# Altium schematic symbol library con-garry (Version 2).SCHLIB: 610 symbols (part 16 of 21)

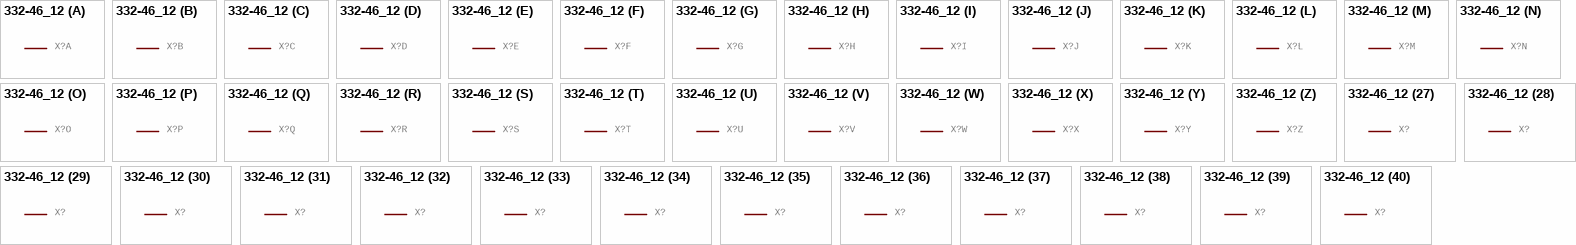
[diagram p345: symbol 332-46_12]

## 332-46_12
designator X?, comment 46 Pin - 2mm Dual Row   Source: www.mpe-connector.de / garry_shortform_2012.pdf  (value not drawn)
GateName_1: -1; SymbolName_1: MV; GateName_2: -2; GateName_3: -3; SymbolName_3: M; GateName_4: -4; GateName_5: -5; GateName_6: -6; GateName_7: -7; GateName_8: -8; GateName_9: -9; GateName_10: -10; GateName_11: -11; GateName_12: -12; GateName_13: -13; GateName_14: -14; GateName_15: -15; GateName_16: -16; GateName_17: -17; GateName_18: -18; GateName_19: -19; GateName_20: -20; GateName_21: -21; GateName_22: -22; GateName_23: -23; GateName_24: -24; GateName_25: -25; GateName_26: -26; GateName_27: -27; GateName_28: -28; GateName_29: -29; GateName_30: -30; GateName_31: -31; GateName_32: -32; GateName_33: -33; GateName_34: -34; GateName_35: -35; GateName_36: -36; GateName_37: -37; GateName_38: -38; GateName_39: -39; GateName_40: -40; GateName_41: -41; GateName_42: -42; GateName_43: -43; GateName_44: -44; GateName_45: -45; GateName_46: -46; DeviceSetName: 332-46; POPULARITY: 1; SymbolName_2: MV; SymbolName_4: M; SymbolName_5: M; SymbolName_6: M; SymbolName_7: M; SymbolName_8: M; SymbolName_9: M; SymbolName_10: M; SymbolName_11: M; SymbolName_12: M; SymbolName_13: M; SymbolName_14: M; SymbolName_15: M; SymbolName_16: M; SymbolName_17: M; SymbolName_18: M; SymbolName_19: M; SymbolName_20: M; SymbolName_21: M; SymbolName_22: M; SymbolName_23: M; SymbolName_24: M; SymbolName_25: M; SymbolName_26: M; SymbolName_27: M; SymbolName_28: M; SymbolName_29: M; SymbolName_30: M; SymbolName_31: M; SymbolName_32: M; SymbolName_33: M; SymbolName_34: M; SymbolName_35: M; SymbolName_36: M; SymbolName_37: M; SymbolName_38: M; SymbolName_39: M; SymbolName_40: M; SymbolName_41: M; SymbolName_42: M; SymbolName_43: M; SymbolName_44: M; SymbolName_45: M; SymbolName_46: M; LibraryName: con-garry (Version 2); Package: 332-46
footprint 332-46
part A pins: 1 S
part B pins: 2 S
part C pins: 3 S
part D pins: 4 S
part E pins: 5 S
part F pins: 6 S
part G pins: 7 S
part H pins: 8 S
part I pins: 9 S
part J pins: 10 S
part K pins: 11 S
part L pins: 12 S
part M pins: 13 S
part N pins: 14 S
part O pins: 15 S
part P pins: 16 S
part Q pins: 17 S
part R pins: 18 S
part S pins: 19 S
part T pins: 20 S
part U pins: 21 S
part V pins: 22 S
part W pins: 23 S
part X pins: 24 S
part Y pins: 25 S
part Z pins: 26 S
part 27 pins: 27 S
part 28 pins: 28 S
part 29 pins: 29 S
part 30 pins: 30 S
part 31 pins: 31 S
part 32 pins: 32 S
part 33 pins: 33 S
part 34 pins: 34 S
part 35 pins: 35 S
part 36 pins: 36 S
part 37 pins: 37 S
part 38 pins: 38 S
part 39 pins: 39 S
part 40 pins: 40 S
part 41 pins: 41 S
part 42 pins: 42 S
part 43 pins: 43 S
part 44 pins: 44 S
part 45 pins: 45 S
part 46 pins: 46 S

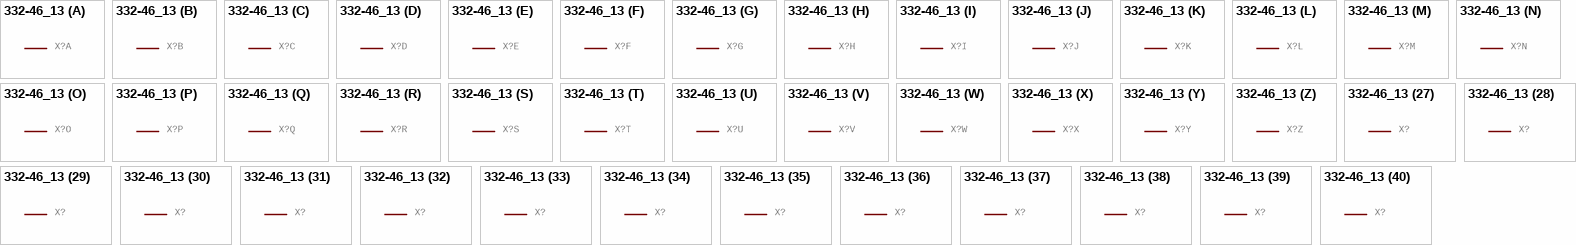
[diagram p346: symbol 332-46_13]

## 332-46_13
designator X?, comment 46 Pin - 2mm Dual Row   Source: www.mpe-connector.de / garry_shortform_2012.pdf  (value not drawn)
GateName_1: -1; SymbolName_1: MV; GateName_2: -2; GateName_3: -3; SymbolName_3: M; GateName_4: -4; GateName_5: -5; GateName_6: -6; GateName_7: -7; GateName_8: -8; GateName_9: -9; GateName_10: -10; GateName_11: -11; GateName_12: -12; GateName_13: -13; GateName_14: -14; GateName_15: -15; GateName_16: -16; GateName_17: -17; GateName_18: -18; GateName_19: -19; GateName_20: -20; GateName_21: -21; GateName_22: -22; GateName_23: -23; GateName_24: -24; GateName_25: -25; GateName_26: -26; GateName_27: -27; GateName_28: -28; GateName_29: -29; GateName_30: -30; GateName_31: -31; GateName_32: -32; GateName_33: -33; GateName_34: -34; GateName_35: -35; GateName_36: -36; GateName_37: -37; GateName_38: -38; GateName_39: -39; GateName_40: -40; GateName_41: -41; GateName_42: -42; GateName_43: -43; GateName_44: -44; GateName_45: -45; GateName_46: -46; DeviceSetName: 332-46; POPULARITY: 1; SymbolName_2: MV; SymbolName_4: M; SymbolName_5: M; SymbolName_6: M; SymbolName_7: M; SymbolName_8: M; SymbolName_9: M; SymbolName_10: M; SymbolName_11: M; SymbolName_12: M; SymbolName_13: M; SymbolName_14: M; SymbolName_15: M; SymbolName_16: M; SymbolName_17: M; SymbolName_18: M; SymbolName_19: M; SymbolName_20: M; SymbolName_21: M; SymbolName_22: M; SymbolName_23: M; SymbolName_24: M; SymbolName_25: M; SymbolName_26: M; SymbolName_27: M; SymbolName_28: M; SymbolName_29: M; SymbolName_30: M; SymbolName_31: M; SymbolName_32: M; SymbolName_33: M; SymbolName_34: M; SymbolName_35: M; SymbolName_36: M; SymbolName_37: M; SymbolName_38: M; SymbolName_39: M; SymbolName_40: M; SymbolName_41: M; SymbolName_42: M; SymbolName_43: M; SymbolName_44: M; SymbolName_45: M; SymbolName_46: M; LibraryName: con-garry (Version 2); Package: 332-46
footprint 332-46
part A pins: 1 S
part B pins: 2 S
part C pins: 3 S
part D pins: 4 S
part E pins: 5 S
part F pins: 6 S
part G pins: 7 S
part H pins: 8 S
part I pins: 9 S
part J pins: 10 S
part K pins: 11 S
part L pins: 12 S
part M pins: 13 S
part N pins: 14 S
part O pins: 15 S
part P pins: 16 S
part Q pins: 17 S
part R pins: 18 S
part S pins: 19 S
part T pins: 20 S
part U pins: 21 S
part V pins: 22 S
part W pins: 23 S
part X pins: 24 S
part Y pins: 25 S
part Z pins: 26 S
part 27 pins: 27 S
part 28 pins: 28 S
part 29 pins: 29 S
part 30 pins: 30 S
part 31 pins: 31 S
part 32 pins: 32 S
part 33 pins: 33 S
part 34 pins: 34 S
part 35 pins: 35 S
part 36 pins: 36 S
part 37 pins: 37 S
part 38 pins: 38 S
part 39 pins: 39 S
part 40 pins: 40 S
part 41 pins: 41 S
part 42 pins: 42 S
part 43 pins: 43 S
part 44 pins: 44 S
part 45 pins: 45 S
part 46 pins: 46 S

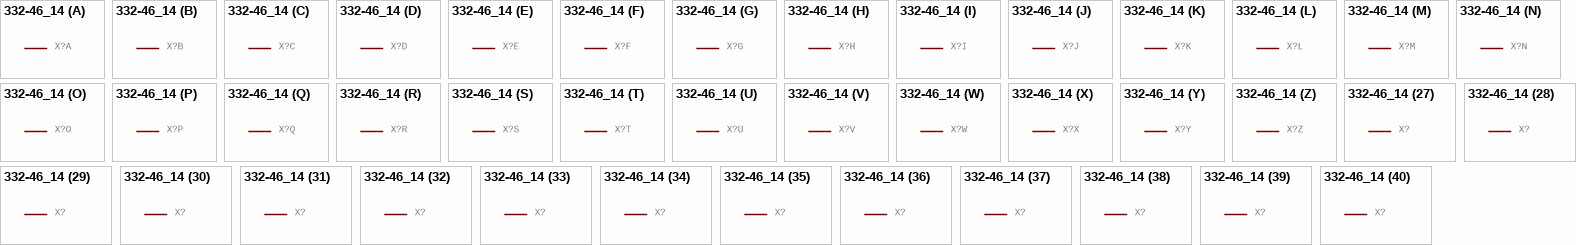
[diagram p347: symbol 332-46_14]

## 332-46_14
designator X?, comment 46 Pin - 2mm Dual Row   Source: www.mpe-connector.de / garry_shortform_2012.pdf  (value not drawn)
GateName_1: -1; SymbolName_1: MV; GateName_2: -2; GateName_3: -3; SymbolName_3: M; GateName_4: -4; GateName_5: -5; GateName_6: -6; GateName_7: -7; GateName_8: -8; GateName_9: -9; GateName_10: -10; GateName_11: -11; GateName_12: -12; GateName_13: -13; GateName_14: -14; GateName_15: -15; GateName_16: -16; GateName_17: -17; GateName_18: -18; GateName_19: -19; GateName_20: -20; GateName_21: -21; GateName_22: -22; GateName_23: -23; GateName_24: -24; GateName_25: -25; GateName_26: -26; GateName_27: -27; GateName_28: -28; GateName_29: -29; GateName_30: -30; GateName_31: -31; GateName_32: -32; GateName_33: -33; GateName_34: -34; GateName_35: -35; GateName_36: -36; GateName_37: -37; GateName_38: -38; GateName_39: -39; GateName_40: -40; GateName_41: -41; GateName_42: -42; GateName_43: -43; GateName_44: -44; GateName_45: -45; GateName_46: -46; DeviceSetName: 332-46; POPULARITY: 1; SymbolName_2: MV; SymbolName_4: M; SymbolName_5: M; SymbolName_6: M; SymbolName_7: M; SymbolName_8: M; SymbolName_9: M; SymbolName_10: M; SymbolName_11: M; SymbolName_12: M; SymbolName_13: M; SymbolName_14: M; SymbolName_15: M; SymbolName_16: M; SymbolName_17: M; SymbolName_18: M; SymbolName_19: M; SymbolName_20: M; SymbolName_21: M; SymbolName_22: M; SymbolName_23: M; SymbolName_24: M; SymbolName_25: M; SymbolName_26: M; SymbolName_27: M; SymbolName_28: M; SymbolName_29: M; SymbolName_30: M; SymbolName_31: M; SymbolName_32: M; SymbolName_33: M; SymbolName_34: M; SymbolName_35: M; SymbolName_36: M; SymbolName_37: M; SymbolName_38: M; SymbolName_39: M; SymbolName_40: M; SymbolName_41: M; SymbolName_42: M; SymbolName_43: M; SymbolName_44: M; SymbolName_45: M; SymbolName_46: M; LibraryName: con-garry (Version 2); Package: 332-46
footprint 332-46
part A pins: 1 S
part B pins: 2 S
part C pins: 3 S
part D pins: 4 S
part E pins: 5 S
part F pins: 6 S
part G pins: 7 S
part H pins: 8 S
part I pins: 9 S
part J pins: 10 S
part K pins: 11 S
part L pins: 12 S
part M pins: 13 S
part N pins: 14 S
part O pins: 15 S
part P pins: 16 S
part Q pins: 17 S
part R pins: 18 S
part S pins: 19 S
part T pins: 20 S
part U pins: 21 S
part V pins: 22 S
part W pins: 23 S
part X pins: 24 S
part Y pins: 25 S
part Z pins: 26 S
part 27 pins: 27 S
part 28 pins: 28 S
part 29 pins: 29 S
part 30 pins: 30 S
part 31 pins: 31 S
part 32 pins: 32 S
part 33 pins: 33 S
part 34 pins: 34 S
part 35 pins: 35 S
part 36 pins: 36 S
part 37 pins: 37 S
part 38 pins: 38 S
part 39 pins: 39 S
part 40 pins: 40 S
part 41 pins: 41 S
part 42 pins: 42 S
part 43 pins: 43 S
part 44 pins: 44 S
part 45 pins: 45 S
part 46 pins: 46 S

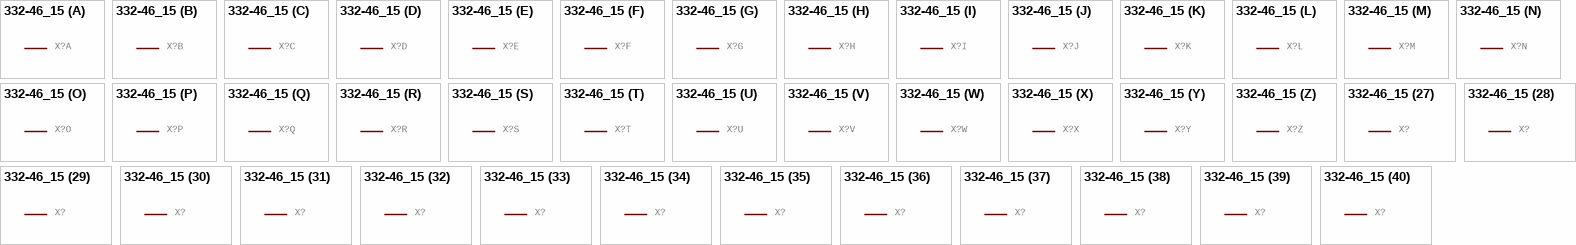
[diagram p348: symbol 332-46_15]

## 332-46_15
designator X?, comment 46 Pin - 2mm Dual Row   Source: www.mpe-connector.de / garry_shortform_2012.pdf  (value not drawn)
GateName_1: -1; SymbolName_1: MV; GateName_2: -2; GateName_3: -3; SymbolName_3: M; GateName_4: -4; GateName_5: -5; GateName_6: -6; GateName_7: -7; GateName_8: -8; GateName_9: -9; GateName_10: -10; GateName_11: -11; GateName_12: -12; GateName_13: -13; GateName_14: -14; GateName_15: -15; GateName_16: -16; GateName_17: -17; GateName_18: -18; GateName_19: -19; GateName_20: -20; GateName_21: -21; GateName_22: -22; GateName_23: -23; GateName_24: -24; GateName_25: -25; GateName_26: -26; GateName_27: -27; GateName_28: -28; GateName_29: -29; GateName_30: -30; GateName_31: -31; GateName_32: -32; GateName_33: -33; GateName_34: -34; GateName_35: -35; GateName_36: -36; GateName_37: -37; GateName_38: -38; GateName_39: -39; GateName_40: -40; GateName_41: -41; GateName_42: -42; GateName_43: -43; GateName_44: -44; GateName_45: -45; GateName_46: -46; DeviceSetName: 332-46; POPULARITY: 1; SymbolName_2: MV; SymbolName_4: M; SymbolName_5: M; SymbolName_6: M; SymbolName_7: M; SymbolName_8: M; SymbolName_9: M; SymbolName_10: M; SymbolName_11: M; SymbolName_12: M; SymbolName_13: M; SymbolName_14: M; SymbolName_15: M; SymbolName_16: M; SymbolName_17: M; SymbolName_18: M; SymbolName_19: M; SymbolName_20: M; SymbolName_21: M; SymbolName_22: M; SymbolName_23: M; SymbolName_24: M; SymbolName_25: M; SymbolName_26: M; SymbolName_27: M; SymbolName_28: M; SymbolName_29: M; SymbolName_30: M; SymbolName_31: M; SymbolName_32: M; SymbolName_33: M; SymbolName_34: M; SymbolName_35: M; SymbolName_36: M; SymbolName_37: M; SymbolName_38: M; SymbolName_39: M; SymbolName_40: M; SymbolName_41: M; SymbolName_42: M; SymbolName_43: M; SymbolName_44: M; SymbolName_45: M; SymbolName_46: M; LibraryName: con-garry (Version 2); Package: 332-46
footprint 332-46
part A pins: 1 S
part B pins: 2 S
part C pins: 3 S
part D pins: 4 S
part E pins: 5 S
part F pins: 6 S
part G pins: 7 S
part H pins: 8 S
part I pins: 9 S
part J pins: 10 S
part K pins: 11 S
part L pins: 12 S
part M pins: 13 S
part N pins: 14 S
part O pins: 15 S
part P pins: 16 S
part Q pins: 17 S
part R pins: 18 S
part S pins: 19 S
part T pins: 20 S
part U pins: 21 S
part V pins: 22 S
part W pins: 23 S
part X pins: 24 S
part Y pins: 25 S
part Z pins: 26 S
part 27 pins: 27 S
part 28 pins: 28 S
part 29 pins: 29 S
part 30 pins: 30 S
part 31 pins: 31 S
part 32 pins: 32 S
part 33 pins: 33 S
part 34 pins: 34 S
part 35 pins: 35 S
part 36 pins: 36 S
part 37 pins: 37 S
part 38 pins: 38 S
part 39 pins: 39 S
part 40 pins: 40 S
part 41 pins: 41 S
part 42 pins: 42 S
part 43 pins: 43 S
part 44 pins: 44 S
part 45 pins: 45 S
part 46 pins: 46 S

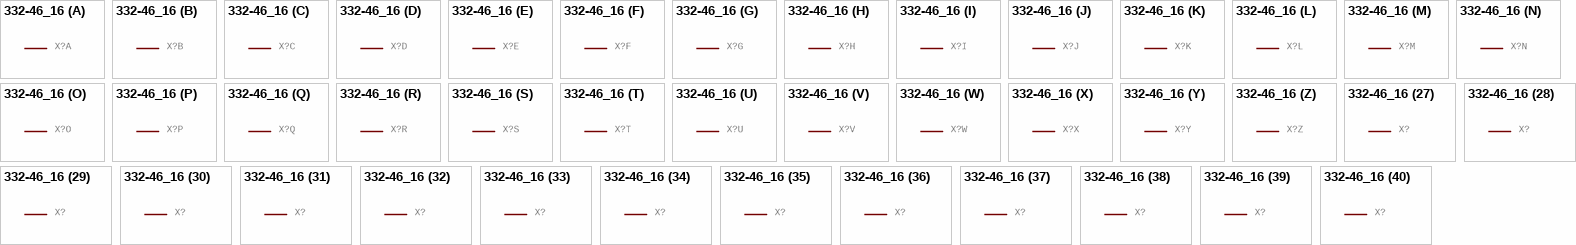
[diagram p349: symbol 332-46_16]

## 332-46_16
designator X?, comment 46 Pin - 2mm Dual Row   Source: www.mpe-connector.de / garry_shortform_2012.pdf  (value not drawn)
GateName_1: -1; SymbolName_1: MV; GateName_2: -2; GateName_3: -3; SymbolName_3: M; GateName_4: -4; GateName_5: -5; GateName_6: -6; GateName_7: -7; GateName_8: -8; GateName_9: -9; GateName_10: -10; GateName_11: -11; GateName_12: -12; GateName_13: -13; GateName_14: -14; GateName_15: -15; GateName_16: -16; GateName_17: -17; GateName_18: -18; GateName_19: -19; GateName_20: -20; GateName_21: -21; GateName_22: -22; GateName_23: -23; GateName_24: -24; GateName_25: -25; GateName_26: -26; GateName_27: -27; GateName_28: -28; GateName_29: -29; GateName_30: -30; GateName_31: -31; GateName_32: -32; GateName_33: -33; GateName_34: -34; GateName_35: -35; GateName_36: -36; GateName_37: -37; GateName_38: -38; GateName_39: -39; GateName_40: -40; GateName_41: -41; GateName_42: -42; GateName_43: -43; GateName_44: -44; GateName_45: -45; GateName_46: -46; DeviceSetName: 332-46; POPULARITY: 1; SymbolName_2: MV; SymbolName_4: M; SymbolName_5: M; SymbolName_6: M; SymbolName_7: M; SymbolName_8: M; SymbolName_9: M; SymbolName_10: M; SymbolName_11: M; SymbolName_12: M; SymbolName_13: M; SymbolName_14: M; SymbolName_15: M; SymbolName_16: M; SymbolName_17: M; SymbolName_18: M; SymbolName_19: M; SymbolName_20: M; SymbolName_21: M; SymbolName_22: M; SymbolName_23: M; SymbolName_24: M; SymbolName_25: M; SymbolName_26: M; SymbolName_27: M; SymbolName_28: M; SymbolName_29: M; SymbolName_30: M; SymbolName_31: M; SymbolName_32: M; SymbolName_33: M; SymbolName_34: M; SymbolName_35: M; SymbolName_36: M; SymbolName_37: M; SymbolName_38: M; SymbolName_39: M; SymbolName_40: M; SymbolName_41: M; SymbolName_42: M; SymbolName_43: M; SymbolName_44: M; SymbolName_45: M; SymbolName_46: M; LibraryName: con-garry (Version 2); Package: 332-46
footprint 332-46
part A pins: 1 S
part B pins: 2 S
part C pins: 3 S
part D pins: 4 S
part E pins: 5 S
part F pins: 6 S
part G pins: 7 S
part H pins: 8 S
part I pins: 9 S
part J pins: 10 S
part K pins: 11 S
part L pins: 12 S
part M pins: 13 S
part N pins: 14 S
part O pins: 15 S
part P pins: 16 S
part Q pins: 17 S
part R pins: 18 S
part S pins: 19 S
part T pins: 20 S
part U pins: 21 S
part V pins: 22 S
part W pins: 23 S
part X pins: 24 S
part Y pins: 25 S
part Z pins: 26 S
part 27 pins: 27 S
part 28 pins: 28 S
part 29 pins: 29 S
part 30 pins: 30 S
part 31 pins: 31 S
part 32 pins: 32 S
part 33 pins: 33 S
part 34 pins: 34 S
part 35 pins: 35 S
part 36 pins: 36 S
part 37 pins: 37 S
part 38 pins: 38 S
part 39 pins: 39 S
part 40 pins: 40 S
part 41 pins: 41 S
part 42 pins: 42 S
part 43 pins: 43 S
part 44 pins: 44 S
part 45 pins: 45 S
part 46 pins: 46 S

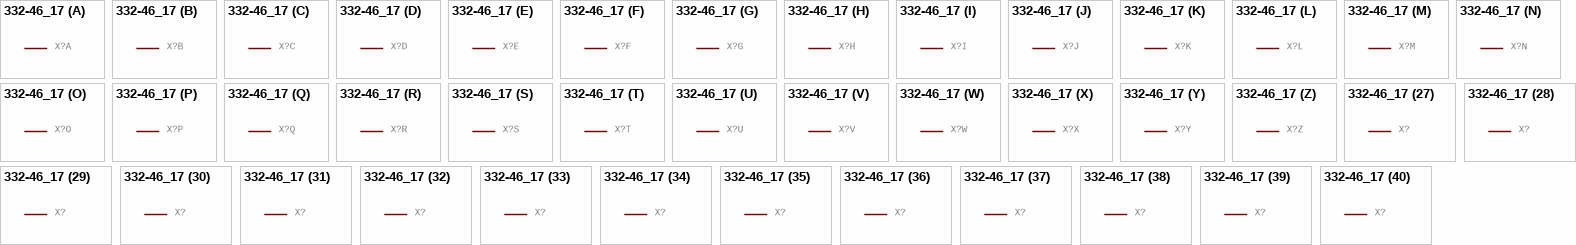
[diagram p350: symbol 332-46_17]

## 332-46_17
designator X?, comment 46 Pin - 2mm Dual Row   Source: www.mpe-connector.de / garry_shortform_2012.pdf  (value not drawn)
GateName_1: -1; SymbolName_1: MV; GateName_2: -2; GateName_3: -3; SymbolName_3: M; GateName_4: -4; GateName_5: -5; GateName_6: -6; GateName_7: -7; GateName_8: -8; GateName_9: -9; GateName_10: -10; GateName_11: -11; GateName_12: -12; GateName_13: -13; GateName_14: -14; GateName_15: -15; GateName_16: -16; GateName_17: -17; GateName_18: -18; GateName_19: -19; GateName_20: -20; GateName_21: -21; GateName_22: -22; GateName_23: -23; GateName_24: -24; GateName_25: -25; GateName_26: -26; GateName_27: -27; GateName_28: -28; GateName_29: -29; GateName_30: -30; GateName_31: -31; GateName_32: -32; GateName_33: -33; GateName_34: -34; GateName_35: -35; GateName_36: -36; GateName_37: -37; GateName_38: -38; GateName_39: -39; GateName_40: -40; GateName_41: -41; GateName_42: -42; GateName_43: -43; GateName_44: -44; GateName_45: -45; GateName_46: -46; DeviceSetName: 332-46; POPULARITY: 1; SymbolName_2: MV; SymbolName_4: M; SymbolName_5: M; SymbolName_6: M; SymbolName_7: M; SymbolName_8: M; SymbolName_9: M; SymbolName_10: M; SymbolName_11: M; SymbolName_12: M; SymbolName_13: M; SymbolName_14: M; SymbolName_15: M; SymbolName_16: M; SymbolName_17: M; SymbolName_18: M; SymbolName_19: M; SymbolName_20: M; SymbolName_21: M; SymbolName_22: M; SymbolName_23: M; SymbolName_24: M; SymbolName_25: M; SymbolName_26: M; SymbolName_27: M; SymbolName_28: M; SymbolName_29: M; SymbolName_30: M; SymbolName_31: M; SymbolName_32: M; SymbolName_33: M; SymbolName_34: M; SymbolName_35: M; SymbolName_36: M; SymbolName_37: M; SymbolName_38: M; SymbolName_39: M; SymbolName_40: M; SymbolName_41: M; SymbolName_42: M; SymbolName_43: M; SymbolName_44: M; SymbolName_45: M; SymbolName_46: M; LibraryName: con-garry (Version 2); Package: 332-46
footprint 332-46
part A pins: 1 S
part B pins: 2 S
part C pins: 3 S
part D pins: 4 S
part E pins: 5 S
part F pins: 6 S
part G pins: 7 S
part H pins: 8 S
part I pins: 9 S
part J pins: 10 S
part K pins: 11 S
part L pins: 12 S
part M pins: 13 S
part N pins: 14 S
part O pins: 15 S
part P pins: 16 S
part Q pins: 17 S
part R pins: 18 S
part S pins: 19 S
part T pins: 20 S
part U pins: 21 S
part V pins: 22 S
part W pins: 23 S
part X pins: 24 S
part Y pins: 25 S
part Z pins: 26 S
part 27 pins: 27 S
part 28 pins: 28 S
part 29 pins: 29 S
part 30 pins: 30 S
part 31 pins: 31 S
part 32 pins: 32 S
part 33 pins: 33 S
part 34 pins: 34 S
part 35 pins: 35 S
part 36 pins: 36 S
part 37 pins: 37 S
part 38 pins: 38 S
part 39 pins: 39 S
part 40 pins: 40 S
part 41 pins: 41 S
part 42 pins: 42 S
part 43 pins: 43 S
part 44 pins: 44 S
part 45 pins: 45 S
part 46 pins: 46 S

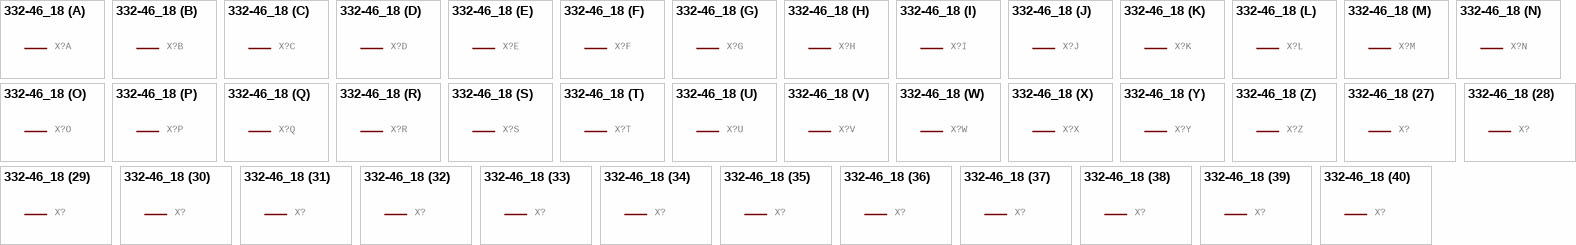
[diagram p351: symbol 332-46_18]

## 332-46_18
designator X?, comment 46 Pin - 2mm Dual Row   Source: www.mpe-connector.de / garry_shortform_2012.pdf  (value not drawn)
GateName_1: -1; SymbolName_1: MV; GateName_2: -2; GateName_3: -3; SymbolName_3: M; GateName_4: -4; GateName_5: -5; GateName_6: -6; GateName_7: -7; GateName_8: -8; GateName_9: -9; GateName_10: -10; GateName_11: -11; GateName_12: -12; GateName_13: -13; GateName_14: -14; GateName_15: -15; GateName_16: -16; GateName_17: -17; GateName_18: -18; GateName_19: -19; GateName_20: -20; GateName_21: -21; GateName_22: -22; GateName_23: -23; GateName_24: -24; GateName_25: -25; GateName_26: -26; GateName_27: -27; GateName_28: -28; GateName_29: -29; GateName_30: -30; GateName_31: -31; GateName_32: -32; GateName_33: -33; GateName_34: -34; GateName_35: -35; GateName_36: -36; GateName_37: -37; GateName_38: -38; GateName_39: -39; GateName_40: -40; GateName_41: -41; GateName_42: -42; GateName_43: -43; GateName_44: -44; GateName_45: -45; GateName_46: -46; DeviceSetName: 332-46; POPULARITY: 1; SymbolName_2: MV; SymbolName_4: M; SymbolName_5: M; SymbolName_6: M; SymbolName_7: M; SymbolName_8: M; SymbolName_9: M; SymbolName_10: M; SymbolName_11: M; SymbolName_12: M; SymbolName_13: M; SymbolName_14: M; SymbolName_15: M; SymbolName_16: M; SymbolName_17: M; SymbolName_18: M; SymbolName_19: M; SymbolName_20: M; SymbolName_21: M; SymbolName_22: M; SymbolName_23: M; SymbolName_24: M; SymbolName_25: M; SymbolName_26: M; SymbolName_27: M; SymbolName_28: M; SymbolName_29: M; SymbolName_30: M; SymbolName_31: M; SymbolName_32: M; SymbolName_33: M; SymbolName_34: M; SymbolName_35: M; SymbolName_36: M; SymbolName_37: M; SymbolName_38: M; SymbolName_39: M; SymbolName_40: M; SymbolName_41: M; SymbolName_42: M; SymbolName_43: M; SymbolName_44: M; SymbolName_45: M; SymbolName_46: M; LibraryName: con-garry (Version 2); Package: 332-46
footprint 332-46
part A pins: 1 S
part B pins: 2 S
part C pins: 3 S
part D pins: 4 S
part E pins: 5 S
part F pins: 6 S
part G pins: 7 S
part H pins: 8 S
part I pins: 9 S
part J pins: 10 S
part K pins: 11 S
part L pins: 12 S
part M pins: 13 S
part N pins: 14 S
part O pins: 15 S
part P pins: 16 S
part Q pins: 17 S
part R pins: 18 S
part S pins: 19 S
part T pins: 20 S
part U pins: 21 S
part V pins: 22 S
part W pins: 23 S
part X pins: 24 S
part Y pins: 25 S
part Z pins: 26 S
part 27 pins: 27 S
part 28 pins: 28 S
part 29 pins: 29 S
part 30 pins: 30 S
part 31 pins: 31 S
part 32 pins: 32 S
part 33 pins: 33 S
part 34 pins: 34 S
part 35 pins: 35 S
part 36 pins: 36 S
part 37 pins: 37 S
part 38 pins: 38 S
part 39 pins: 39 S
part 40 pins: 40 S
part 41 pins: 41 S
part 42 pins: 42 S
part 43 pins: 43 S
part 44 pins: 44 S
part 45 pins: 45 S
part 46 pins: 46 S

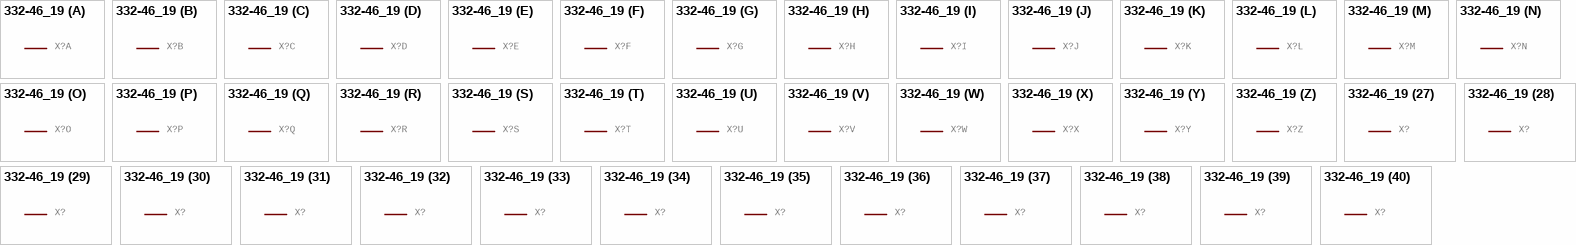
[diagram p352: symbol 332-46_19]

## 332-46_19
designator X?, comment 46 Pin - 2mm Dual Row   Source: www.mpe-connector.de / garry_shortform_2012.pdf  (value not drawn)
GateName_1: -1; SymbolName_1: MV; GateName_2: -2; GateName_3: -3; SymbolName_3: M; GateName_4: -4; GateName_5: -5; GateName_6: -6; GateName_7: -7; GateName_8: -8; GateName_9: -9; GateName_10: -10; GateName_11: -11; GateName_12: -12; GateName_13: -13; GateName_14: -14; GateName_15: -15; GateName_16: -16; GateName_17: -17; GateName_18: -18; GateName_19: -19; GateName_20: -20; GateName_21: -21; GateName_22: -22; GateName_23: -23; GateName_24: -24; GateName_25: -25; GateName_26: -26; GateName_27: -27; GateName_28: -28; GateName_29: -29; GateName_30: -30; GateName_31: -31; GateName_32: -32; GateName_33: -33; GateName_34: -34; GateName_35: -35; GateName_36: -36; GateName_37: -37; GateName_38: -38; GateName_39: -39; GateName_40: -40; GateName_41: -41; GateName_42: -42; GateName_43: -43; GateName_44: -44; GateName_45: -45; GateName_46: -46; DeviceSetName: 332-46; POPULARITY: 1; SymbolName_2: MV; SymbolName_4: M; SymbolName_5: M; SymbolName_6: M; SymbolName_7: M; SymbolName_8: M; SymbolName_9: M; SymbolName_10: M; SymbolName_11: M; SymbolName_12: M; SymbolName_13: M; SymbolName_14: M; SymbolName_15: M; SymbolName_16: M; SymbolName_17: M; SymbolName_18: M; SymbolName_19: M; SymbolName_20: M; SymbolName_21: M; SymbolName_22: M; SymbolName_23: M; SymbolName_24: M; SymbolName_25: M; SymbolName_26: M; SymbolName_27: M; SymbolName_28: M; SymbolName_29: M; SymbolName_30: M; SymbolName_31: M; SymbolName_32: M; SymbolName_33: M; SymbolName_34: M; SymbolName_35: M; SymbolName_36: M; SymbolName_37: M; SymbolName_38: M; SymbolName_39: M; SymbolName_40: M; SymbolName_41: M; SymbolName_42: M; SymbolName_43: M; SymbolName_44: M; SymbolName_45: M; SymbolName_46: M; LibraryName: con-garry (Version 2); Package: 332-46
footprint 332-46
part A pins: 1 S
part B pins: 2 S
part C pins: 3 S
part D pins: 4 S
part E pins: 5 S
part F pins: 6 S
part G pins: 7 S
part H pins: 8 S
part I pins: 9 S
part J pins: 10 S
part K pins: 11 S
part L pins: 12 S
part M pins: 13 S
part N pins: 14 S
part O pins: 15 S
part P pins: 16 S
part Q pins: 17 S
part R pins: 18 S
part S pins: 19 S
part T pins: 20 S
part U pins: 21 S
part V pins: 22 S
part W pins: 23 S
part X pins: 24 S
part Y pins: 25 S
part Z pins: 26 S
part 27 pins: 27 S
part 28 pins: 28 S
part 29 pins: 29 S
part 30 pins: 30 S
part 31 pins: 31 S
part 32 pins: 32 S
part 33 pins: 33 S
part 34 pins: 34 S
part 35 pins: 35 S
part 36 pins: 36 S
part 37 pins: 37 S
part 38 pins: 38 S
part 39 pins: 39 S
part 40 pins: 40 S
part 41 pins: 41 S
part 42 pins: 42 S
part 43 pins: 43 S
part 44 pins: 44 S
part 45 pins: 45 S
part 46 pins: 46 S

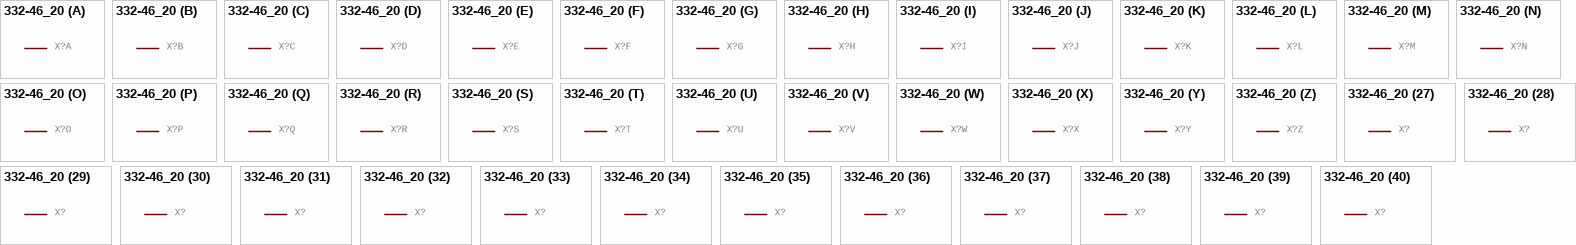
[diagram p353: symbol 332-46_20]

## 332-46_20
designator X?, comment 46 Pin - 2mm Dual Row   Source: www.mpe-connector.de / garry_shortform_2012.pdf  (value not drawn)
GateName_1: -1; SymbolName_1: MV; GateName_2: -2; GateName_3: -3; SymbolName_3: M; GateName_4: -4; GateName_5: -5; GateName_6: -6; GateName_7: -7; GateName_8: -8; GateName_9: -9; GateName_10: -10; GateName_11: -11; GateName_12: -12; GateName_13: -13; GateName_14: -14; GateName_15: -15; GateName_16: -16; GateName_17: -17; GateName_18: -18; GateName_19: -19; GateName_20: -20; GateName_21: -21; GateName_22: -22; GateName_23: -23; GateName_24: -24; GateName_25: -25; GateName_26: -26; GateName_27: -27; GateName_28: -28; GateName_29: -29; GateName_30: -30; GateName_31: -31; GateName_32: -32; GateName_33: -33; GateName_34: -34; GateName_35: -35; GateName_36: -36; GateName_37: -37; GateName_38: -38; GateName_39: -39; GateName_40: -40; GateName_41: -41; GateName_42: -42; GateName_43: -43; GateName_44: -44; GateName_45: -45; GateName_46: -46; DeviceSetName: 332-46; POPULARITY: 1; SymbolName_2: MV; SymbolName_4: M; SymbolName_5: M; SymbolName_6: M; SymbolName_7: M; SymbolName_8: M; SymbolName_9: M; SymbolName_10: M; SymbolName_11: M; SymbolName_12: M; SymbolName_13: M; SymbolName_14: M; SymbolName_15: M; SymbolName_16: M; SymbolName_17: M; SymbolName_18: M; SymbolName_19: M; SymbolName_20: M; SymbolName_21: M; SymbolName_22: M; SymbolName_23: M; SymbolName_24: M; SymbolName_25: M; SymbolName_26: M; SymbolName_27: M; SymbolName_28: M; SymbolName_29: M; SymbolName_30: M; SymbolName_31: M; SymbolName_32: M; SymbolName_33: M; SymbolName_34: M; SymbolName_35: M; SymbolName_36: M; SymbolName_37: M; SymbolName_38: M; SymbolName_39: M; SymbolName_40: M; SymbolName_41: M; SymbolName_42: M; SymbolName_43: M; SymbolName_44: M; SymbolName_45: M; SymbolName_46: M; LibraryName: con-garry (Version 2); Package: 332-46
footprint 332-46
part A pins: 1 S
part B pins: 2 S
part C pins: 3 S
part D pins: 4 S
part E pins: 5 S
part F pins: 6 S
part G pins: 7 S
part H pins: 8 S
part I pins: 9 S
part J pins: 10 S
part K pins: 11 S
part L pins: 12 S
part M pins: 13 S
part N pins: 14 S
part O pins: 15 S
part P pins: 16 S
part Q pins: 17 S
part R pins: 18 S
part S pins: 19 S
part T pins: 20 S
part U pins: 21 S
part V pins: 22 S
part W pins: 23 S
part X pins: 24 S
part Y pins: 25 S
part Z pins: 26 S
part 27 pins: 27 S
part 28 pins: 28 S
part 29 pins: 29 S
part 30 pins: 30 S
part 31 pins: 31 S
part 32 pins: 32 S
part 33 pins: 33 S
part 34 pins: 34 S
part 35 pins: 35 S
part 36 pins: 36 S
part 37 pins: 37 S
part 38 pins: 38 S
part 39 pins: 39 S
part 40 pins: 40 S
part 41 pins: 41 S
part 42 pins: 42 S
part 43 pins: 43 S
part 44 pins: 44 S
part 45 pins: 45 S
part 46 pins: 46 S

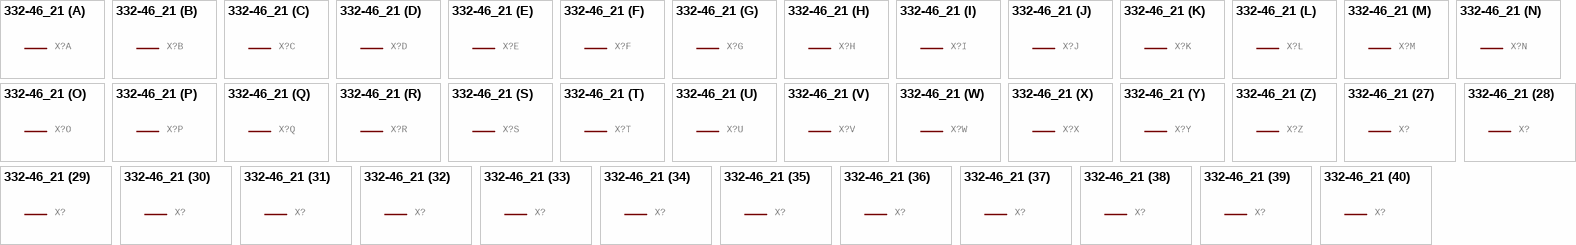
[diagram p354: symbol 332-46_21]

## 332-46_21
designator X?, comment 46 Pin - 2mm Dual Row   Source: www.mpe-connector.de / garry_shortform_2012.pdf  (value not drawn)
GateName_1: -1; SymbolName_1: MV; GateName_2: -2; GateName_3: -3; SymbolName_3: M; GateName_4: -4; GateName_5: -5; GateName_6: -6; GateName_7: -7; GateName_8: -8; GateName_9: -9; GateName_10: -10; GateName_11: -11; GateName_12: -12; GateName_13: -13; GateName_14: -14; GateName_15: -15; GateName_16: -16; GateName_17: -17; GateName_18: -18; GateName_19: -19; GateName_20: -20; GateName_21: -21; GateName_22: -22; GateName_23: -23; GateName_24: -24; GateName_25: -25; GateName_26: -26; GateName_27: -27; GateName_28: -28; GateName_29: -29; GateName_30: -30; GateName_31: -31; GateName_32: -32; GateName_33: -33; GateName_34: -34; GateName_35: -35; GateName_36: -36; GateName_37: -37; GateName_38: -38; GateName_39: -39; GateName_40: -40; GateName_41: -41; GateName_42: -42; GateName_43: -43; GateName_44: -44; GateName_45: -45; GateName_46: -46; DeviceSetName: 332-46; POPULARITY: 1; SymbolName_2: MV; SymbolName_4: M; SymbolName_5: M; SymbolName_6: M; SymbolName_7: M; SymbolName_8: M; SymbolName_9: M; SymbolName_10: M; SymbolName_11: M; SymbolName_12: M; SymbolName_13: M; SymbolName_14: M; SymbolName_15: M; SymbolName_16: M; SymbolName_17: M; SymbolName_18: M; SymbolName_19: M; SymbolName_20: M; SymbolName_21: M; SymbolName_22: M; SymbolName_23: M; SymbolName_24: M; SymbolName_25: M; SymbolName_26: M; SymbolName_27: M; SymbolName_28: M; SymbolName_29: M; SymbolName_30: M; SymbolName_31: M; SymbolName_32: M; SymbolName_33: M; SymbolName_34: M; SymbolName_35: M; SymbolName_36: M; SymbolName_37: M; SymbolName_38: M; SymbolName_39: M; SymbolName_40: M; SymbolName_41: M; SymbolName_42: M; SymbolName_43: M; SymbolName_44: M; SymbolName_45: M; SymbolName_46: M; LibraryName: con-garry (Version 2); Package: 332-46
footprint 332-46
part A pins: 1 S
part B pins: 2 S
part C pins: 3 S
part D pins: 4 S
part E pins: 5 S
part F pins: 6 S
part G pins: 7 S
part H pins: 8 S
part I pins: 9 S
part J pins: 10 S
part K pins: 11 S
part L pins: 12 S
part M pins: 13 S
part N pins: 14 S
part O pins: 15 S
part P pins: 16 S
part Q pins: 17 S
part R pins: 18 S
part S pins: 19 S
part T pins: 20 S
part U pins: 21 S
part V pins: 22 S
part W pins: 23 S
part X pins: 24 S
part Y pins: 25 S
part Z pins: 26 S
part 27 pins: 27 S
part 28 pins: 28 S
part 29 pins: 29 S
part 30 pins: 30 S
part 31 pins: 31 S
part 32 pins: 32 S
part 33 pins: 33 S
part 34 pins: 34 S
part 35 pins: 35 S
part 36 pins: 36 S
part 37 pins: 37 S
part 38 pins: 38 S
part 39 pins: 39 S
part 40 pins: 40 S
part 41 pins: 41 S
part 42 pins: 42 S
part 43 pins: 43 S
part 44 pins: 44 S
part 45 pins: 45 S
part 46 pins: 46 S

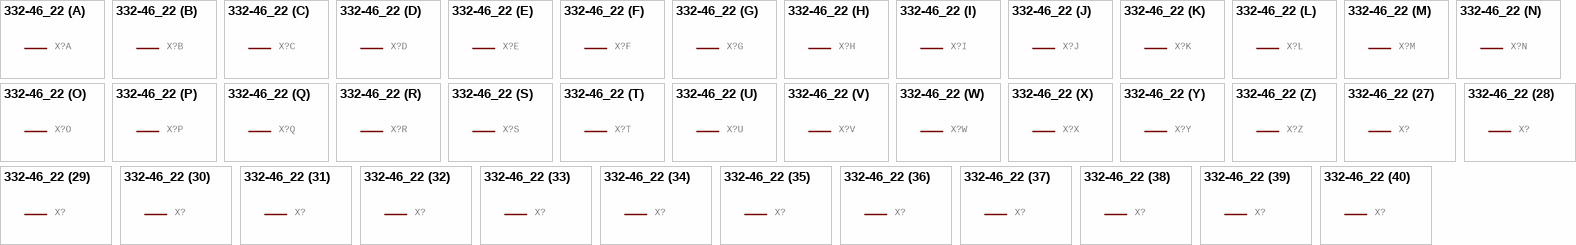
[diagram p355: symbol 332-46_22]

## 332-46_22
designator X?, comment 46 Pin - 2mm Dual Row   Source: www.mpe-connector.de / garry_shortform_2012.pdf  (value not drawn)
GateName_1: -1; SymbolName_1: MV; GateName_2: -2; GateName_3: -3; SymbolName_3: M; GateName_4: -4; GateName_5: -5; GateName_6: -6; GateName_7: -7; GateName_8: -8; GateName_9: -9; GateName_10: -10; GateName_11: -11; GateName_12: -12; GateName_13: -13; GateName_14: -14; GateName_15: -15; GateName_16: -16; GateName_17: -17; GateName_18: -18; GateName_19: -19; GateName_20: -20; GateName_21: -21; GateName_22: -22; GateName_23: -23; GateName_24: -24; GateName_25: -25; GateName_26: -26; GateName_27: -27; GateName_28: -28; GateName_29: -29; GateName_30: -30; GateName_31: -31; GateName_32: -32; GateName_33: -33; GateName_34: -34; GateName_35: -35; GateName_36: -36; GateName_37: -37; GateName_38: -38; GateName_39: -39; GateName_40: -40; GateName_41: -41; GateName_42: -42; GateName_43: -43; GateName_44: -44; GateName_45: -45; GateName_46: -46; DeviceSetName: 332-46; POPULARITY: 1; SymbolName_2: MV; SymbolName_4: M; SymbolName_5: M; SymbolName_6: M; SymbolName_7: M; SymbolName_8: M; SymbolName_9: M; SymbolName_10: M; SymbolName_11: M; SymbolName_12: M; SymbolName_13: M; SymbolName_14: M; SymbolName_15: M; SymbolName_16: M; SymbolName_17: M; SymbolName_18: M; SymbolName_19: M; SymbolName_20: M; SymbolName_21: M; SymbolName_22: M; SymbolName_23: M; SymbolName_24: M; SymbolName_25: M; SymbolName_26: M; SymbolName_27: M; SymbolName_28: M; SymbolName_29: M; SymbolName_30: M; SymbolName_31: M; SymbolName_32: M; SymbolName_33: M; SymbolName_34: M; SymbolName_35: M; SymbolName_36: M; SymbolName_37: M; SymbolName_38: M; SymbolName_39: M; SymbolName_40: M; SymbolName_41: M; SymbolName_42: M; SymbolName_43: M; SymbolName_44: M; SymbolName_45: M; SymbolName_46: M; LibraryName: con-garry (Version 2); Package: 332-46
footprint 332-46
part A pins: 1 S
part B pins: 2 S
part C pins: 3 S
part D pins: 4 S
part E pins: 5 S
part F pins: 6 S
part G pins: 7 S
part H pins: 8 S
part I pins: 9 S
part J pins: 10 S
part K pins: 11 S
part L pins: 12 S
part M pins: 13 S
part N pins: 14 S
part O pins: 15 S
part P pins: 16 S
part Q pins: 17 S
part R pins: 18 S
part S pins: 19 S
part T pins: 20 S
part U pins: 21 S
part V pins: 22 S
part W pins: 23 S
part X pins: 24 S
part Y pins: 25 S
part Z pins: 26 S
part 27 pins: 27 S
part 28 pins: 28 S
part 29 pins: 29 S
part 30 pins: 30 S
part 31 pins: 31 S
part 32 pins: 32 S
part 33 pins: 33 S
part 34 pins: 34 S
part 35 pins: 35 S
part 36 pins: 36 S
part 37 pins: 37 S
part 38 pins: 38 S
part 39 pins: 39 S
part 40 pins: 40 S
part 41 pins: 41 S
part 42 pins: 42 S
part 43 pins: 43 S
part 44 pins: 44 S
part 45 pins: 45 S
part 46 pins: 46 S

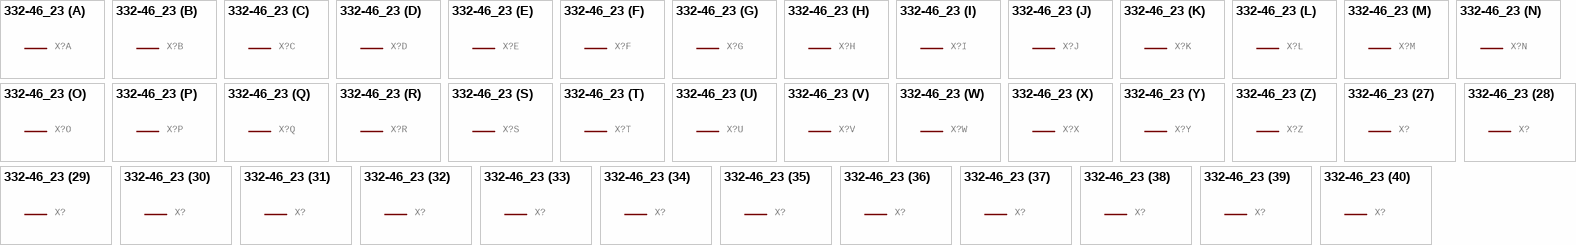
[diagram p356: symbol 332-46_23]
